# Altium footprint library ICs And Semiconductors THD.PcbLib: 350 footprints (part 7 of 22)
Each footprint in its own frame and in the unit in brackets; x right, y up, seen from the top. Pads: shape width x height; smd on the part's side, far side on the other; paste and mask are expansions set on the pad; w line width, h text height; cw(c..) or ccw(c..) is an arc to the next point about the centre after c.
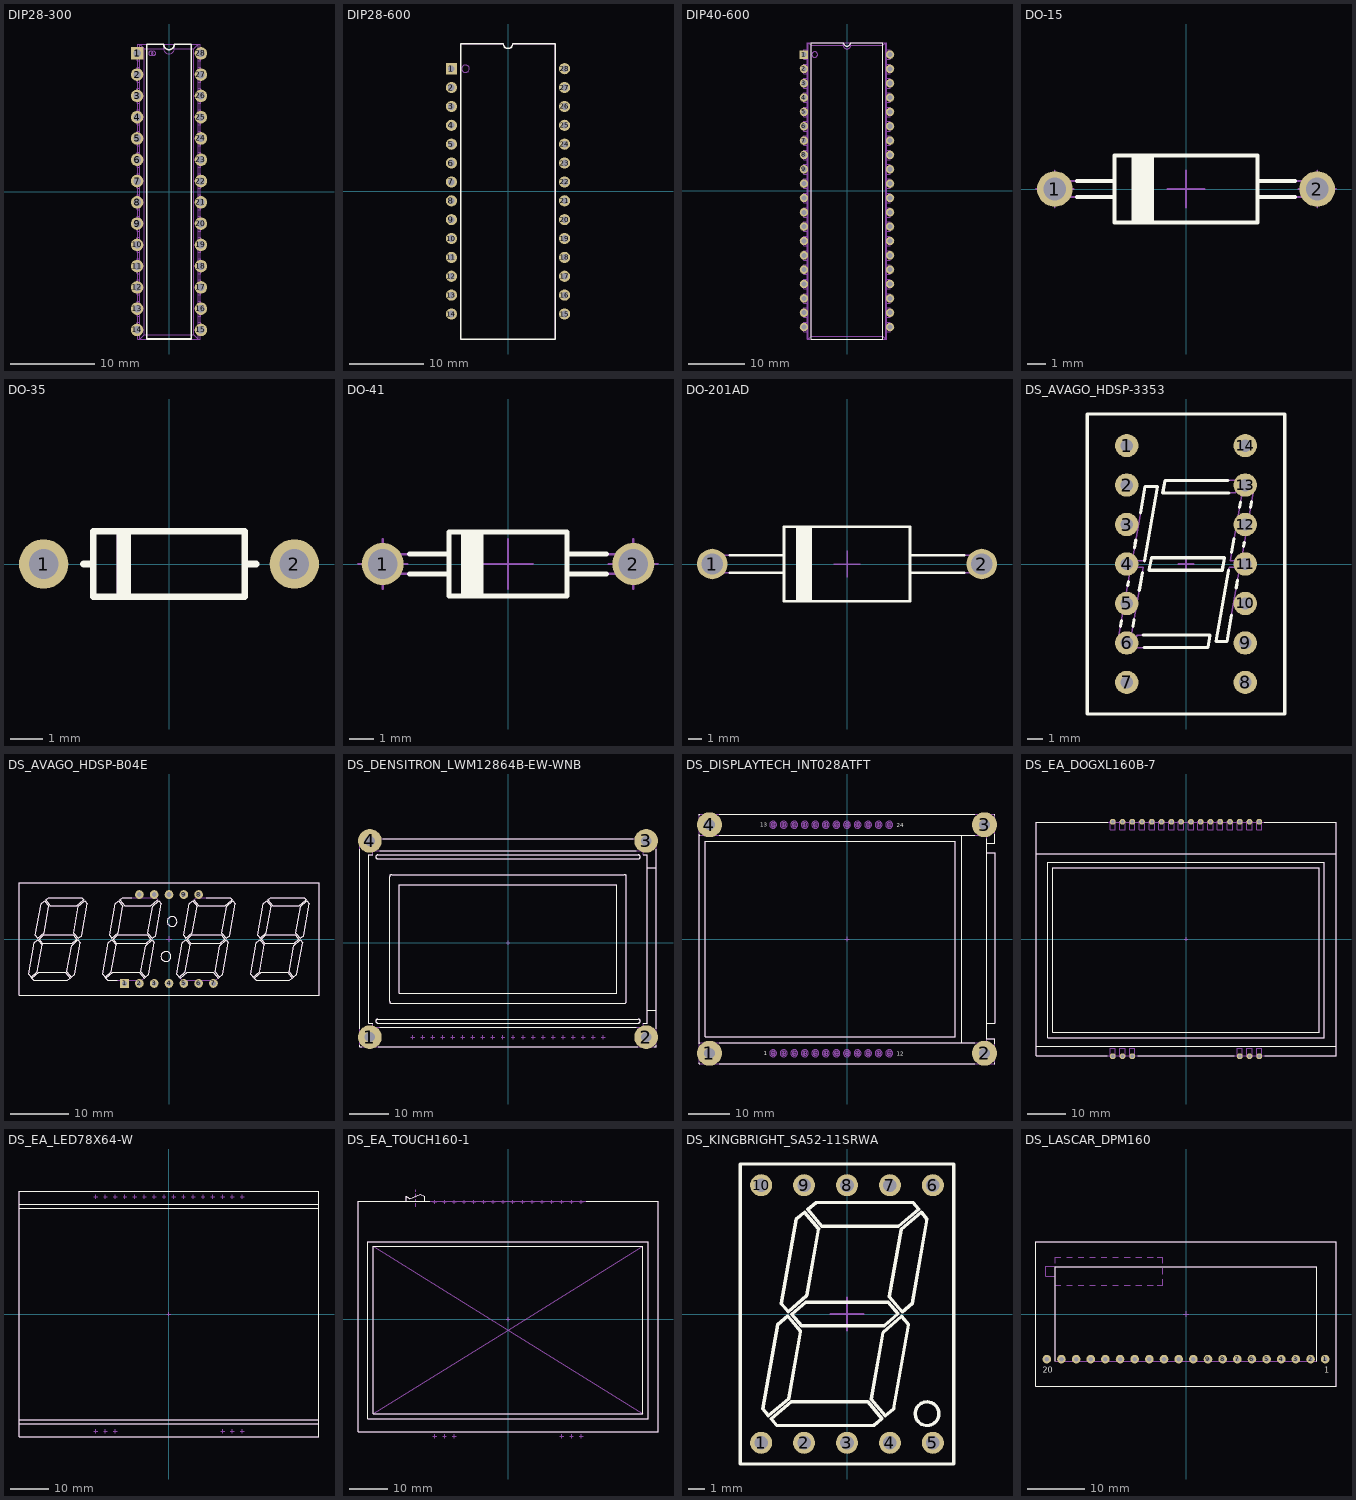
[diagram p6: the footprints below, top view; thin cyan lines are the x and y axes]

## DIP28-300 [mm] "DIP 28 Leads, Row Spacing 7.62mm; Pitch 2.54mm"
height 4.57
pads (28):
  rect 1.5x1.5 hole 0.9: 1(-3.81,16.51)
  round 1.5 hole 0.9: 2(-3.81,13.97) 3(-3.81,11.43) 4(-3.81,8.89) 5(-3.81,6.35) 6(-3.81,3.81) 7(-3.81,1.27) 8(-3.81,-1.27) 9(-3.81,-3.81) 10(-3.81,-6.35) 11(-3.81,-8.89) 12(-3.81,-11.43) 13(-3.81,-13.97) 14(-3.81,-16.51) 15(3.81,-16.51) 16(3.81,-13.97) 17(3.81,-11.43) 18(3.81,-8.89) 19(3.81,-6.35) 20(3.81,-3.81) 21(3.81,-1.27) 22(3.81,1.27) 23(3.81,3.81) 24(3.81,6.35) 25(3.81,8.89) 26(3.81,11.43) 27(3.81,13.97) 28(3.81,16.51)
Top Overlay:
  lines w0.2: -2.65,-17.59 -2.65,17.59 -0.635,17.59 ccw(c0,17.59) 0.635,17.59 2.65,17.59 2.65,-17.59 -2.65,-17.59
Notvisible:
  drawing of 205 lines, arcs and shapes, not listed
Mechanical 14:
  circle w0.1: c-1.84,16.51 r0.254
  lines w0.1: -3.745,-17.59 -3.745,17.59 -0.635,17.59 ccw(c0,17.59) 0.635,17.59 3.745,17.59 3.745,-17.59 -3.745,-17.59
3D body "DIP28-300.stp": height 4.57, standoff -3.3, extent -3.935,-17.59 3.935,17.59

## DIP28-600 [mm] "28 Leads Dual In-Line Package, Row Spacing 15.24mm; Pitch 2.54mm"
height 5.59
pads (28):
  rect 1.5x1.5 hole 0.9: 1(-7.62,16.51)
  round 1.5 hole 0.9: 2(-7.62,13.97) 3(-7.62,11.43) 4(-7.62,8.89) 5(-7.62,6.35) 6(-7.62,3.81) 7(-7.62,1.27) 8(-7.62,-1.27) 9(-7.62,-3.81) 10(-7.62,-6.35) 11(-7.62,-8.89) 12(-7.62,-11.43) 13(-7.62,-13.97) 14(-7.62,-16.51) 15(7.62,-16.51) 16(7.62,-13.97) 17(7.62,-11.43) 18(7.62,-8.89) 19(7.62,-6.35) 20(7.62,-3.81) 21(7.62,-1.27) 22(7.62,1.27) 23(7.62,3.81) 24(7.62,6.35) 25(7.62,8.89) 26(7.62,11.43) 27(7.62,13.97) 28(7.62,16.51)
Top Overlay:
  lines w0.2: -6.35,-19.875 6.35,-19.875 6.35,19.875 0.635,19.875 cw(c0,19.875) -0.635,19.875 -6.35,19.875 -6.35,-19.875
Mechanical 14:
  circle w0.1: c-5.715,16.51 r0.5
  lines w0.1: -6.35,-19.875 6.35,-19.875 6.35,19.875 0.635,19.875 cw(c0,19.875) -0.635,19.875 -6.35,19.875 -6.35,-19.875
3D body "DIP28-600.stp": height 5.33, standoff -3.3, extent -7.745,-19.875 7.745,19.875

## DIP40-600 [mm] "40 Leads Dual In-Line Package, Row Spacing 15.24mm; Pitch 2.54mm"
height 4.7
pads (40):
  rect 1.5x1.5 hole 0.9: 1(-7.62,24.13)
  round 1.5 hole 0.9: 2(-7.62,21.59) 3(-7.62,19.05) 4(-7.62,16.51) 5(-7.62,13.97) 6(-7.62,11.43) 7(-7.62,8.89) 8(-7.62,6.35) 9(-7.62,3.81) 10(-7.62,1.27) 11(-7.62,-1.27) 12(-7.62,-3.81) 13(-7.62,-6.35) 14(-7.62,-8.89) 15(-7.62,-11.43) 16(-7.62,-13.97) 17(-7.62,-16.51) 18(-7.62,-19.05) 19(-7.62,-21.59) 20(-7.62,-24.13) 21(7.62,-24.13) 22(7.62,-21.59) 23(7.62,-19.05) 24(7.62,-16.51) 25(7.62,-13.97) 26(7.62,-11.43) 27(7.62,-8.89) 28(7.62,-6.35) 29(7.62,-3.81) 30(7.62,-1.27) 31(7.62,1.27) 32(7.62,3.81) 33(7.62,6.35) 34(7.62,8.89) 35(7.62,11.43) 36(7.62,13.97) 37(7.62,16.51) 38(7.62,19.05) 39(7.62,21.59) 40(7.62,24.13)
Top Overlay:
  lines w0.2: -6.35,-26.25 6.35,-26.25 6.35,26.25 0.635,26.25 cw(c0,26.25) -0.635,26.25 -6.35,26.25 -6.35,-26.25
Notvisible:
  drawing of 297 lines, arcs and shapes, not listed
Mechanical 14:
  circle w0.1: c-5.715,24.13 r0.5
  lines w0.1: -7.05,-26.25 7.05,-26.25 7.05,26.25 0.635,26.25 cw(c0,26.25) -0.635,26.25 -7.05,26.25 -7.05,-26.25
3D body "DIP40-600.stp": height 4.7, standoff -3.05, extent -7.8,-26.25 7.8,26.25

## DO-15 [mm] "DO-15, Diode, Axial, Body 7.62 x 3.56mm (LxDia. Max), Pin spacing 13.97mm"
height 3.56
pads (2):
  round 1.9 hole 1.2: 1(-6.985,0) 2(6.985,0)
Top Overlay:
  lines w0.2: -5.8,-0.43 -3.81,-0.43 ; -5.8,0.43 -3.81,0.43 ; -2.81,-1.78 -2.81,1.78 ; -2.71,-1.78 -2.71,1.78 ; -2.61,-1.78 -2.61,1.78 ; -2.51,-1.78 -2.51,1.78 ; -2.31,-1.78 -2.31,1.78 ; -2.21,-1.78 -2.21,1.78 ; -2.11,-1.78 -2.11,1.78 ; -2.01,-1.78 -2.01,1.78 ; -1.91,-1.78 -1.91,1.78 ; -1.81,-1.78 -1.81,1.78 ; 3.81,-0.43 5.8,-0.43 ; 3.81,0.43 5.8,0.43 ; -3.81,-1.78 -3.81,1.78 3.81,1.78 3.81,-1.78 -3.81,-1.78 ; -2.41,-1.78 -2.41,1.78 -2.41,-1.78
Notvisible:
  lines w0.1: -7.985,0 -6.985,0 ; -6.985,-1 -6.985,0 ; -6.985,1 -6.985,0 ; -5.985,0 -6.985,0 ; -1,0 0,0 ; 0,-1 0,0 ; 0,1 0,0 ; 1,0 0,0 ; 5.985,0 6.985,0 ; 6.985,-1 6.985,0 ; 6.985,1 6.985,0 ; 7.985,0 6.985,0
Mechanical 14:
  lines w0.1: -3.81,-0.43 -6.985,-0.43 cw(c-6.985,0) -6.985,0.43 -3.81,0.43 ; -2.81,-1.78 -2.81,1.78 ; -2.71,-1.78 -2.71,1.78 ; -2.61,-1.78 -2.61,1.78 ; -2.51,-1.78 -2.51,1.78 ; -2.31,-1.78 -2.31,1.78 ; -2.21,-1.78 -2.21,1.78 ; -2.11,-1.78 -2.11,1.78 ; -2.01,-1.78 -2.01,1.78 ; -1.91,-1.78 -1.91,1.78 ; -1.81,-1.78 -1.81,1.78 ; 3.81,-0.43 6.985,-0.43 ccw(c6.985,0) 6.985,0.43 3.81,0.43 ; -3.81,-1.78 3.81,-1.78 3.81,1.78 -3.81,1.78 -3.81,-1.78 ; -2.41,-1.78 -2.41,1.78 -2.41,-1.78
3D body "DO-15.stp": height 3.56, standoff -3.2, extent -7.415,-1.78 7.415,1.78

## DO-35 [mm] "Diode, Axial, Body 4.6 x 2 mm (LxDia. max), Pin spacing 7.62mm"
height 2
pads (2):
  round 1.5 hole 0.9: 1(-3.81,0) 2(3.81,0)
Top Overlay:
  lines w0.2: -2.6,0 -2.35,0 ; -1.499,-1 -1.499,0.999 ; -1.45,-1 -1.45,0.999 ; -1.401,-1 -1.401,0.999 ; -1.352,-1 -1.352,0.999 ; -1.303,-1 -1.303,0.999 ; -1.254,-1 -1.254,0.999 ; 2.4,0 2.65,0 ; -2.298,-1 -2.298,1 2.3,1 2.3,-1 -2.298,-1
Mechanical 14:
  lines w0.1: -2.6,0 -2.35,0 ; -1.55,-1 -1.55,1 ; -1.501,-1 -1.501,1 ; -1.499,-1 -1.499,1 ; -1.452,-1 -1.452,1 ; -1.403,-1 -1.403,1 ; -1.354,-1 -1.354,1 ; -1.305,-1 -1.305,1 ; -1.205,-1 -1.205,1 ; 2.35,0 2.6,0 ; -2.3,-1 2.3,-1 2.3,1 -2.3,1 -2.3,-1 ; -1.45,-1 -1.45,1 -1.45,-1 ; -1.401,-1 -1.401,1 -1.401,-1 ; -1.352,-1 -1.352,1 -1.352,-1 ; -1.303,-1 -1.303,1 -1.303,-1 ; -1.254,-1 -1.254,1 -1.254,-1
3D body "DO-35.stp": height 1.91, standoff -3, extent -4.076,-0.955 4.077,0.955

## DO-41 [mm] "DO-41, Diode, Axial, Body 4.7 x 2.7 mm (LxDia. max), Pin spacing 10.16mm"
height 2.8
pads (2):
  round 1.7 hole 1.2: 1(-5.08,0) 2(5.08,0)
Top Overlay:
  lines w0.2: -4.002,-0.4 -2.4,-0.4 ; -4.002,0.4 -2.4,0.4 ; -1.8,-1.3 -1.8,1.3 ; -1.7,-1.3 -1.7,1.3 ; -1.6,-1.3 -1.6,1.3 ; -1.5,-1.3 -1.5,1.3 ; -1.4,-1.3 -1.4,1.3 ; -1.3,-1.3 -1.3,1.3 ; -1.2,-1.3 -1.2,1.3 ; -1.1,-1.3 -1.1,1.3 ; 2.4,-0.4 4.002,-0.4 ; 2.4,0.4 4.002,0.4 ; -2.4,-1.3 2.4,-1.3 2.4,1.3 -2.4,1.3 -2.4,-1.3
Notvisible:
  lines w0.1: -6.08,0 -5.08,0 ; -5.08,-1 -5.08,0 ; -5.08,1 -5.08,0 ; -4.08,0 -5.08,0 ; -1,0 0,0 ; 0,-1 0,0 ; 0,1 0,0 ; 1,0 0,0 ; 4.08,0 5.08,0 ; 5.08,-1 5.08,0 ; 5.08,1 5.08,0 ; 6.08,0 5.08,0
Mechanical 14:
  lines w0.1: -2.4,-0.4 -5.08,-0.4 cw(c-5.08,0) -5.08,0.4 -2.4,0.4 ; -1.8,-1.3 -1.8,1.3 ; -1.7,-1.3 -1.7,1.3 ; -1.6,-1.3 -1.6,1.3 ; -1.5,-1.3 -1.5,1.3 ; -1.4,-1.3 -1.4,1.3 ; -1.3,-1.3 -1.3,1.3 ; -1.2,-1.3 -1.2,1.3 ; -1.1,-1.3 -1.1,1.3 ; 2.4,-0.4 5.08,-0.4 ccw(c5.08,0) 5.08,0.4 2.4,0.4 ; -2.4,-1.3 -2.4,1.3 2.4,1.3 2.4,-1.3 -2.4,-1.3
3D body "DO-41.stp": height 2.6, standoff -3.2, extent -5.48,-1.3 5.48,1.3

## DO-201AD [mm] "DO-201AD, Diode, Axial; Lead Spacing 20.32mm, Lead Dia. 1.3mm, Body Length 9.5mm, Body Dia. 5.6mm"
height 5.6
pads (2):
  round 2.3 hole 1.6: 1(-10.16,0) 2(10.16,0)
Top Overlay:
  lines w0.2: -8.85,-0.65 -4.75,-0.65 ; -8.85,0.65 -4.75,0.65 ; -3.75,-2.8 -3.75,2.8 ; -3.55,-2.8 -3.55,2.8 ; -3.35,-2.8 -3.35,2.8 ; -3.15,-2.8 -3.15,2.8 ; -2.95,-2.8 -2.95,2.8 ; -2.75,-2.8 -2.75,2.8 ; 4.75,-0.65 8.85,-0.65 ; 4.75,0.65 8.85,0.65 ; -4.75,-2.8 4.75,-2.8 4.75,2.8 -4.75,2.8 -4.75,-2.8
Notvisible:
  lines w0.1: -11.16,0 -10.16,0 ; -10.16,-1 -10.16,0 ; -10.16,1 -10.16,0 ; -9.16,0 -10.16,0 ; -1,0 0,0 ; 0,-1 0,0 ; 0,1 0,0 ; 1,0 0,0 ; 9.16,0 10.16,0 ; 10.16,-1 10.16,0 ; 10.16,1 10.16,0 ; 11.16,0 10.16,0
Mechanical 14:
  lines w0.1: -4.75,-0.65 -10.16,-0.65 cw(c-10.16,0) -10.16,0.65 -4.75,0.65 ; -3.75,-2.8 -3.75,2.8 ; -3.55,-2.8 -3.55,2.8 ; -3.35,-2.8 -3.35,2.8 ; -3.15,-2.8 -3.15,2.8 ; -2.95,-2.8 -2.95,2.8 ; -2.75,-2.8 -2.75,2.8 ; 4.75,-0.65 10.16,-0.65 ccw(c10.16,0) 10.16,0.65 4.75,0.65 ; -4.75,-2.8 4.75,-2.8 4.75,2.8 -4.75,2.8 -4.75,-2.8
3D body "DO-201AD.stp": height 5.6, standoff -3.8, extent -10.81,-2.8 10.81,2.8

## DS_AVAGO_HDSP-3353 [mm] "10.9mm Single Digit, Common Cathode, HER Seven Segment Display, Body 12.7x19.05mm"
height 7.87
pads (14):
  round 1.5 hole 0.8: 1(-3.81,7.62) 2(-3.81,5.08) 3(-3.81,2.54) 4(-3.81,0) 5(-3.81,-2.54) 6(-3.81,-5.08) 7(-3.81,-7.62) 8(3.81,-7.62) 9(3.81,-5.08) 10(3.81,-2.54) 11(3.81,0) 12(3.81,2.54) 13(3.81,5.08) 14(3.81,7.62)
Top Overlay:
  lines w0.2: -4.211,-4.002 -4.147,-3.64 ; -3.75,-1.392 -3.707,-1.145 ; -3.411,-4.002 -3.338,-3.589 ; -3.321,1.041 -3.232,1.546 ; -3.008,-1.716 -2.803,-0.555 ; -2.927,3.277 -2.627,4.977 -1.827,4.977 -2.67,0.2 -2.678,0.2 ; -2.776,-4.577 1.548,-4.577 1.407,-5.377 -2.699,-5.377 ; 2.699,5.377 -1.357,5.377 -1.498,4.577 2.776,4.577 ; 2.734,-0.405 1.927,-4.977 2.627,-4.977 2.927,-3.277 ; 2.937,0.749 3.094,1.64 ; 3.232,-1.546 3.321,-1.041 ; 3.445,3.631 3.505,3.971 ; 3.707,1.145 3.75,1.392 ; 4.147,3.64 4.211,4.002 ; -6.35,-9.65 6.35,-9.65 6.35,9.65 -6.35,9.65 -6.35,-9.65 ; -2.372,-0.4 -2.231,0.4 2.472,0.4 2.331,-0.4 -2.372,-0.4
Notvisible:
  lines w0.1: -4.31,-7.62 -3.81,-7.62 ; -4.31,-5.08 -3.81,-5.08 ; -4.31,-2.54 -3.81,-2.54 ; -4.31,0 -3.81,0 ; -4.31,2.54 -3.81,2.54 ; -4.31,5.08 -3.81,5.08 ; -4.31,7.62 -3.81,7.62 ; -3.81,-8.12 -3.81,-7.62 ; -3.81,-7.12 -3.81,-7.62 ; -3.81,-5.58 -3.81,-5.08 ; -3.81,-4.58 -3.81,-5.08 ; -3.81,-3.04 -3.81,-2.54 ; -3.81,-2.04 -3.81,-2.54 ; -3.81,-0.5 -3.81,0 ; -3.81,0.5 -3.81,0 ; -3.81,2.04 -3.81,2.54 ; -3.81,3.04 -3.81,2.54 ; -3.81,4.58 -3.81,5.08 ; -3.81,5.58 -3.81,5.08 ; -3.81,7.12 -3.81,7.62 ; -3.81,8.12 -3.81,7.62 ; -3.31,-7.62 -3.81,-7.62 ; -3.31,-5.08 -3.81,-5.08 ; -3.31,-2.54 -3.81,-2.54 ; -3.31,0 -3.81,0 ; -3.31,2.54 -3.81,2.54 ; -3.31,5.08 -3.81,5.08 ; -3.31,7.62 -3.81,7.62 ; -0.5,0 0,0 ; 0,-0.5 0,0 ; 0,0.5 0,0 ; 0.5,0 0,0 ; 3.31,-7.62 3.81,-7.62 ; 3.31,-5.08 3.81,-5.08 ; 3.31,-2.54 3.81,-2.54 ; 3.31,0 3.81,0 ; 3.31,2.54 3.81,2.54 ; 3.31,5.08 3.81,5.08 ; 3.31,7.62 3.81,7.62 ; 3.81,-8.12 3.81,-7.62 ; 3.81,-7.12 3.81,-7.62 ; 3.81,-5.58 3.81,-5.08 ; 3.81,-4.58 3.81,-5.08 ; 3.81,-3.04 3.81,-2.54 ; 3.81,-2.04 3.81,-2.54 ; 3.81,-0.5 3.81,0 ; 3.81,0.5 3.81,0 ; 3.81,2.04 3.81,2.54 ; 3.81,3.04 3.81,2.54 ; 3.81,4.58 3.81,5.08 ; 3.81,5.58 3.81,5.08 ; 3.81,7.12 3.81,7.62 ; 3.81,8.12 3.81,7.62 ; 4.31,-7.62 3.81,-7.62 ; 4.31,-5.08 3.81,-5.08 ; 4.31,-2.54 3.81,-2.54 ; 4.31,0 3.81,0 ; 4.31,2.54 3.81,2.54 ; 4.31,5.08 3.81,5.08 ; 4.31,7.62 3.81,7.62
Mechanical 14:
  lines w0.1: -6.35,-9.65 6.35,-9.65 6.35,9.65 -6.35,9.65 -6.35,-9.65 ; -4.383,-4.977 -3.583,-4.977 -2.74,-0.2 -3.54,-0.2 -4.383,-4.977 ; -3.47,0.2 -2.627,4.977 -1.827,4.977 -2.67,0.2 -3.47,0.2 ; -3.303,-5.377 1.407,-5.377 1.548,-4.577 -3.162,-4.577 -3.303,-5.377 ; -2.372,-0.4 -2.231,0.4 2.472,0.4 2.331,-0.4 -2.372,-0.4 ; -1.498,4.577 3.212,4.577 3.353,5.377 -1.357,5.377 -1.498,4.577 ; 1.927,-4.977 2.77,-0.2 3.47,-0.2 2.627,-4.977 1.927,-4.977 ; 2.84,0.2 3.683,4.977 4.383,4.977 3.54,0.2 2.84,0.2
3D body "DS_AVAGO_HDSP-3353.stp": height 7.87, standoff -3.6, extent -6.35,-9.65 6.35,9.65

## DS_AVAGO_HDSP-B04E [mm] "Four Digit 0.56\" GaP HER Seven Segment Display"
height 8.25
pads (12):
  rect 1.5x1.5 hole 0.8: 1(-7.62,-7.62)
  round 1.5 hole 0.8: 2(-5.08,-7.62) 3(-2.54,-7.62) 4(0,-7.62) 5(2.54,-7.62) 6(5.08,-7.62) 7(7.62,-7.62) 8(5.08,7.62) 9(2.54,7.62) 10(0,7.62) 11(-2.54,7.62) 12(-5.08,7.62)
Top Overlay:
  drawing of 168 lines, arcs and shapes, not listed
Notvisible:
  lines w0.1: -8.12,-7.62 -7.62,-7.62 ; -7.62,-8.12 -7.62,-7.62 ; -7.62,-7.12 -7.62,-7.62 ; -7.12,-7.62 -7.62,-7.62 ; -5.58,-7.62 -5.08,-7.62 ; -5.58,7.62 -5.08,7.62 ; -5.08,-8.12 -5.08,-7.62 ; -5.08,-7.12 -5.08,-7.62 ; -5.08,7.12 -5.08,7.62 ; -5.08,8.12 -5.08,7.62 ; -4.58,-7.62 -5.08,-7.62 ; -4.58,7.62 -5.08,7.62 ; -3.04,-7.62 -2.54,-7.62 ; -3.04,7.62 -2.54,7.62 ; -2.54,-8.12 -2.54,-7.62 ; -2.54,-7.12 -2.54,-7.62 ; -2.54,7.12 -2.54,7.62 ; -2.54,8.12 -2.54,7.62 ; -2.04,-7.62 -2.54,-7.62 ; -2.04,7.62 -2.54,7.62 ; -0.5,-7.62 0,-7.62 ; -0.5,0 0,0 ; -0.5,7.62 0,7.62 ; 0,-8.12 0,-7.62 ; 0,-7.12 0,-7.62 ; 0,-0.5 0,0 ; 0,0.5 0,0 ; 0,7.12 0,7.62 ; 0,8.12 0,7.62 ; 0.5,-7.62 0,-7.62 ; 0.5,0 0,0 ; 0.5,7.62 0,7.62 ; 2.04,-7.62 2.54,-7.62 ; 2.04,7.62 2.54,7.62 ; 2.54,-8.12 2.54,-7.62 ; 2.54,-7.12 2.54,-7.62 ; 2.54,7.12 2.54,7.62 ; 2.54,8.12 2.54,7.62 ; 3.04,-7.62 2.54,-7.62 ; 3.04,7.62 2.54,7.62 ; 4.58,-7.62 5.08,-7.62 ; 4.58,7.62 5.08,7.62 ; 5.08,-8.12 5.08,-7.62 ; 5.08,-7.12 5.08,-7.62 ; 5.08,7.12 5.08,7.62 ; 5.08,8.12 5.08,7.62 ; 5.58,-7.62 5.08,-7.62 ; 5.58,7.62 5.08,7.62 ; 7.12,-7.62 7.62,-7.62 ; 7.62,-8.12 7.62,-7.62 ; 7.62,-7.12 7.62,-7.62 ; 8.12,-7.62 7.62,-7.62
Mechanical 14:
  drawing of 174 lines, arcs and shapes, not listed
3D body "DS_AVAGO_HDSP-B04E.stp": height 8.25, standoff -3.1, extent -25.725,-9.675 25.725,9.675

## DS_DENSITRON_LWM12864B-EW-WNB [mm] "LCD Display Module, 128x64 Dots,Transmissive Negative, BL White LED, Wide Temp, Negative Voltage Generator, STN Blue"
height 8.9
pads (4):
  round 6 hole 2.6: 1(-35,-23.85) 2(35,-23.85) 3(35,25.85) 4(-35,25.85)
Top Overlay:
  lines w0.2: -37.5,-25.927 -37.5,-26.35 -37.077,-26.35 ; -37.5,-21.773 -37.5,23.773 ; -34.3,-20.3 -35.3,-20.3 -35.3,22.3 -34.3,22.3 ; -32.923,-26.35 32.923,-26.35 ; -32.5,-21.3 32.5,-21.3 ; -32.5,23.3 32.5,23.3 ; -31.789,26.35 31.789,26.35 ; 34.3,-20.3 35.3,-20.3 35.3,22.3 34.3,22.3 ; 35.3,-17 37.5,-17 ; 35.3,19 37.5,19 ; 37.077,-26.35 37.5,-26.35 37.5,-25.927 ; 37.5,-21.773 37.5,23.773 ; -33,-20.3 cw(c-33,-19.8) -33,-19.3 33,-19.3 cw(c33,-19.8) 33,-20.3 -33,-20.3 ; -33,21.3 cw(c-33,21.8) -33,22.3 33,22.3 cw(c33,21.8) 33,21.3 -33,21.3 ; -30,-14.8 ccw(c-29.5,-14.8) -29.5,-15.3 29.5,-15.3 ccw(c29.5,-14.8) 30,-14.8 30,16.8 ccw(c29.5,16.8) 29.5,17.3 -29.5,17.3 ccw(c-29.5,16.8) -30,16.8 -30,-14.8 ; -27.5,-12.74 -27.5,14.74 27.5,14.74 27.5,-12.74 -27.5,-12.74
Notvisible:
  lines w0.1: -35.5,-23.85 -35,-23.85 ; -35.5,25.85 -35,25.85 ; -35,-24.35 -35,-23.85 ; -35,-23.35 -35,-23.85 ; -35,25.35 -35,25.85 ; -35,26.35 -35,25.85 ; -34.5,-23.85 -35,-23.85 ; -34.5,25.85 -35,25.85 ; -24.63,-23.85 -24.13,-23.85 ; -24.13,-24.35 -24.13,-23.85 ; -24.13,-23.35 -24.13,-23.85 ; -23.63,-23.85 -24.13,-23.85 ; -22.09,-23.85 -21.59,-23.85 ; -21.59,-24.35 -21.59,-23.85 ; -21.59,-23.35 -21.59,-23.85 ; -21.09,-23.85 -21.59,-23.85 ; -19.55,-23.85 -19.05,-23.85 ; -19.05,-24.35 -19.05,-23.85 ; -19.05,-23.35 -19.05,-23.85 ; -18.55,-23.85 -19.05,-23.85 ; -17.01,-23.85 -16.51,-23.85 ; -16.51,-24.35 -16.51,-23.85 ; -16.51,-23.35 -16.51,-23.85 ; -16.01,-23.85 -16.51,-23.85 ; -14.47,-23.85 -13.97,-23.85 ; -13.97,-24.35 -13.97,-23.85 ; -13.97,-23.35 -13.97,-23.85 ; -13.47,-23.85 -13.97,-23.85 ; -11.93,-23.85 -11.43,-23.85 ; -11.43,-24.35 -11.43,-23.85 ; -11.43,-23.35 -11.43,-23.85 ; -10.93,-23.85 -11.43,-23.85 ; -9.39,-23.85 -8.89,-23.85 ; -8.89,-24.35 -8.89,-23.85 ; -8.89,-23.35 -8.89,-23.85 ; -8.39,-23.85 -8.89,-23.85 ; -6.85,-23.85 -6.35,-23.85 ; -6.35,-24.35 -6.35,-23.85 ; -6.35,-23.35 -6.35,-23.85 ; -5.85,-23.85 -6.35,-23.85 ; -4.31,-23.85 -3.81,-23.85 ; -3.81,-24.35 -3.81,-23.85 ; -3.81,-23.35 -3.81,-23.85 ; -3.31,-23.85 -3.81,-23.85 ; -1.77,-23.85 -1.27,-23.85 ; -1.27,-24.35 -1.27,-23.85 ; -1.27,-23.35 -1.27,-23.85 ; -0.77,-23.85 -1.27,-23.85 ; -0.5,0 0,0 ; 0,-0.5 0,0 ; 0,0.5 0,0 ; 0.5,0 0,0 ; 0.77,-23.85 1.27,-23.85 ; 1.27,-24.35 1.27,-23.85 ; 1.27,-23.35 1.27,-23.85 ; 1.77,-23.85 1.27,-23.85 ; 3.31,-23.85 3.81,-23.85 ; 3.81,-24.35 3.81,-23.85 ; 3.81,-23.35 3.81,-23.85 ; 4.31,-23.85 3.81,-23.85 ; 5.85,-23.85 6.35,-23.85 ; 6.35,-24.35 6.35,-23.85 ; 6.35,-23.35 6.35,-23.85 ; 6.85,-23.85 6.35,-23.85 ; 8.39,-23.85 8.89,-23.85 ; 8.89,-24.35 8.89,-23.85 ; 8.89,-23.35 8.89,-23.85 ; 9.39,-23.85 8.89,-23.85 ; 10.93,-23.85 11.43,-23.85 ; 11.43,-24.35 11.43,-23.85 ; 11.43,-23.35 11.43,-23.85 ; 11.93,-23.85 11.43,-23.85 ; 13.47,-23.85 13.97,-23.85 ; 13.97,-24.35 13.97,-23.85 ; 13.97,-23.35 13.97,-23.85 ; 14.47,-23.85 13.97,-23.85 ; 16.01,-23.85 16.51,-23.85 ; 16.51,-24.35 16.51,-23.85 ; 16.51,-23.35 16.51,-23.85 ; 17.01,-23.85 16.51,-23.85 ; 18.55,-23.85 19.05,-23.85 ; 19.05,-24.35 19.05,-23.85 ; 19.05,-23.35 19.05,-23.85 ; 19.55,-23.85 19.05,-23.85 ; 21.09,-23.85 21.59,-23.85 ; 21.59,-24.35 21.59,-23.85 ; 21.59,-23.35 21.59,-23.85 ; 22.09,-23.85 21.59,-23.85 ; 23.63,-23.85 24.13,-23.85 ; 24.13,-24.35 24.13,-23.85 ; 24.13,-23.35 24.13,-23.85 ; 24.63,-23.85 24.13,-23.85 ; 34.5,-23.85 35,-23.85 ; 34.5,25.85 35,25.85 ; 35,-24.35 35,-23.85 ; 35,-23.35 35,-23.85 ; 35,25.35 35,25.85 ; 35,26.35 35,25.85 ; 35.5,-23.85 35,-23.85 ; 35.5,25.85 35,25.85
Mechanical 14:
  circle w0.1: c-35,-23.85 r1.25
  circle w0.1: c35,-23.85 r1.25
  lines w0.1: 35.3,-17 37.5,-17 ; 35.3,19 37.5,19 ; -37.5,-26.35 37.5,-26.35 37.5,26.35 35.866,26.35 cw(c35,25.85) 34.134,26.35 -34.134,26.35 cw(c-35,25.85) -35.866,26.35 -37.5,26.35 -37.5,-26.35 ; -35.3,-20.3 -35.3,22.3 -34.3,22.3 -34.3,23.3 34.3,23.3 34.3,22.3 35.3,22.3 35.3,-20.3 34.3,-20.3 34.3,-21.3 -34.3,-21.3 -34.3,-20.3 -35.3,-20.3 ; -33,-20.3 cw(c-33,-19.8) -33,-19.3 33,-19.3 cw(c33,-19.8) 33,-20.3 -33,-20.3 ; -33,21.3 cw(c-33,21.8) -33,22.3 33,22.3 cw(c33,21.8) 33,21.3 -33,21.3 ; -30,-14.8 ccw(c-29.5,-14.8) -29.5,-15.3 29.5,-15.3 ccw(c29.5,-14.8) 30,-14.8 30,16.8 ccw(c29.5,16.8) 29.5,17.3 -29.5,17.3 ccw(c-29.5,16.8) -30,16.8 -30,-14.8 ; -27.5,-12.74 -27.5,14.74 27.5,14.74 27.5,-12.74 -27.5,-12.74
3D body "DS_DENSITRON_LWM12864B-EW-WNB.stp": height 8.9, standoff 0, extent -37.5,-26.35 37.5,26.35

## DS_DISPLAYTECH_INT028ATFT [mm] "2.8\" Integrated TFT Display Module (250RGB x 320 Dots), Body 71.2 x60mm"
height 6.55
pads (4):
  round 6 hole 2.6: 1(-33.1,-27.5) 2(33.1,-27.5) 3(33.1,27.5) 4(-33.1,27.5)
Top Overlay:
  lines w0.2: -35.6,-29.804 -35.6,-30 -35.404,-30 ; -35.6,-25.196 -35.6,25.196 ; -35.6,29.804 -35.6,30 -35.404,30 ; -30.796,-30 30.796,-30 ; -30.796,30 30.796,30 ; 27.6,25 27.6,-25 ; 33.6,-24 35.6,-24 35.6,-25.196 ; 33.6,23 35.6,23 35.6,25.196 ; 35.404,-30 35.6,-30 35.6,-29.804 ; 35.404,30 35.6,30 35.6,29.804 ; -35.6,-25 -35.6,25 ; -35.6,-25 -35.404,-25 -35.6,-25 ; -35.6,25 -35.404,25 -35.6,25 ; -34.1,-23.5 -34.1,23.5 ; -34.1,-23.5 26.1,-23.5 ; -34.1,-23.5 -34.1,23.5 ; -34.1,-23.5 26.1,-23.5 ; -34.1,23.5 26.1,23.5 ; -34.1,23.5 26.1,23.5 ; 26.1,-23.5 26.1,23.5 ; 26.1,-23.5 26.1,23.5 ; 27.6,-25 -30.796,-25 30.796,-25 27.6,-25 ; -30.796,25 30.796,25 -30.796,25 ; 33.599,20.75 33.6,24.137 33.6,-24.137 33.6,-20.25 35.6,-20.25 35.529,20.75 33.599,20.75
  text "13" at -20.893,27.06 h1
  text "24" at 11.967,26.935 h1
  text "12" at 11.967,-28.065 h1
  text "1" at -20.088,-27.965 h1
Notvisible:
  lines w0.1: -33.6,-27.5 -33.1,-27.5 ; -33.6,27.5 -33.1,27.5 ; -33.1,-28 -33.1,-27.5 ; -33.1,-27 -33.1,-27.5 ; -33.1,27 -33.1,27.5 ; -33.1,28 -33.1,27.5 ; -32.6,-27.5 -33.1,-27.5 ; -32.6,27.5 -33.1,27.5 ; -18.28,-27.5 -17.78,-27.5 ; -18.28,27.5 -17.78,27.5 ; -17.78,-28 -17.78,-27.5 ; -17.78,-27 -17.78,-27.5 ; -17.78,27 -17.78,27.5 ; -17.78,28 -17.78,27.5 ; -17.28,-27.5 -17.78,-27.5 ; -17.28,27.5 -17.78,27.5 ; -15.74,-27.5 -15.24,-27.5 ; -15.74,27.5 -15.24,27.5 ; -15.24,-28 -15.24,-27.5 ; -15.24,-27 -15.24,-27.5 ; -15.24,27 -15.24,27.5 ; -15.24,28 -15.24,27.5 ; -14.74,-27.5 -15.24,-27.5 ; -14.74,27.5 -15.24,27.5 ; -13.2,-27.5 -12.7,-27.5 ; -13.2,27.5 -12.7,27.5 ; -12.7,-28 -12.7,-27.5 ; -12.7,-27 -12.7,-27.5 ; -12.7,27 -12.7,27.5 ; -12.7,28 -12.7,27.5 ; -12.2,-27.5 -12.7,-27.5 ; -12.2,27.5 -12.7,27.5 ; -10.66,-27.5 -10.16,-27.5 ; -10.66,27.5 -10.16,27.5 ; -10.16,-28 -10.16,-27.5 ; -10.16,-27 -10.16,-27.5 ; -10.16,27 -10.16,27.5 ; -10.16,28 -10.16,27.5 ; -9.66,-27.5 -10.16,-27.5 ; -9.66,27.5 -10.16,27.5 ; -8.12,-27.5 -7.62,-27.5 ; -8.12,27.5 -7.62,27.5 ; -7.62,-28 -7.62,-27.5 ; -7.62,-27 -7.62,-27.5 ; -7.62,27 -7.62,27.5 ; -7.62,28 -7.62,27.5 ; -7.12,-27.5 -7.62,-27.5 ; -7.12,27.5 -7.62,27.5 ; -5.58,-27.5 -5.08,-27.5 ; -5.58,27.5 -5.08,27.5 ; -5.08,-28 -5.08,-27.5 ; -5.08,-27 -5.08,-27.5 ; -5.08,27 -5.08,27.5 ; -5.08,28 -5.08,27.5 ; -4.58,-27.5 -5.08,-27.5 ; -4.58,27.5 -5.08,27.5 ; -3.04,-27.5 -2.54,-27.5 ; -3.04,27.5 -2.54,27.5 ; -2.54,-28 -2.54,-27.5 ; -2.54,-27 -2.54,-27.5 ; -2.54,27 -2.54,27.5 ; -2.54,28 -2.54,27.5 ; -2.04,-27.5 -2.54,-27.5 ; -2.04,27.5 -2.54,27.5 ; -0.5,-27.5 0,-27.5 ; -0.5,0 0,0 ; -0.5,27.5 0,27.5 ; 0,-28 0,-27.5 ; 0,-27 0,-27.5 ; 0,-0.5 0,0 ; 0,0.5 0,0 ; 0,27 0,27.5 ; 0,28 0,27.5 ; 0.5,-27.5 0,-27.5 ; 0.5,0 0,0 ; 0.5,27.5 0,27.5 ; 2.04,-27.5 2.54,-27.5 ; 2.04,27.5 2.54,27.5 ; 2.54,-28 2.54,-27.5 ; 2.54,-27 2.54,-27.5 ; 2.54,27 2.54,27.5 ; 2.54,28 2.54,27.5 ; 3.04,-27.5 2.54,-27.5 ; 3.04,27.5 2.54,27.5 ; 4.58,-27.5 5.08,-27.5 ; 4.58,27.5 5.08,27.5 ; 5.08,-28 5.08,-27.5 ; 5.08,-27 5.08,-27.5 ; 5.08,27 5.08,27.5 ; 5.08,28 5.08,27.5 ; 5.58,-27.5 5.08,-27.5 ; 5.58,27.5 5.08,27.5 ; 7.12,-27.5 7.62,-27.5 ; 7.12,27.5 7.62,27.5 ; 7.62,-28 7.62,-27.5 ; 7.62,-27 7.62,-27.5 ; 7.62,27 7.62,27.5 ; 7.62,28 7.62,27.5 ; 8.12,-27.5 7.62,-27.5 ; 8.12,27.5 7.62,27.5 ; 9.66,-27.5 10.16,-27.5 ; 9.66,27.5 10.16,27.5 ; 10.16,-28 10.16,-27.5 ; 10.16,-27 10.16,-27.5 ; 10.16,27 10.16,27.5 ; 10.16,28 10.16,27.5 ; 10.66,-27.5 10.16,-27.5 ; 10.66,27.5 10.16,27.5 ; 32.6,-27.5 33.1,-27.5 ; 32.6,27.5 33.1,27.5 ; 33.1,-28 33.1,-27.5 ; 33.1,-27 33.1,-27.5 ; 33.1,27 33.1,27.5 ; 33.1,28 33.1,27.5 ; 33.6,-27.5 33.1,-27.5 ; 33.6,27.5 33.1,27.5